# Altium footprint library My Footprint.PcbLib: 268 footprints (part 8 of 17)
Each footprint in its own frame and in the unit in brackets; x right, y up, seen from the top. Pads: shape width x height; smd on the part's side, far side on the other; paste and mask are expansions set on the pad; w line width, h text height; cw(c..) or ccw(c..) is an arc to the next point about the centre after c.
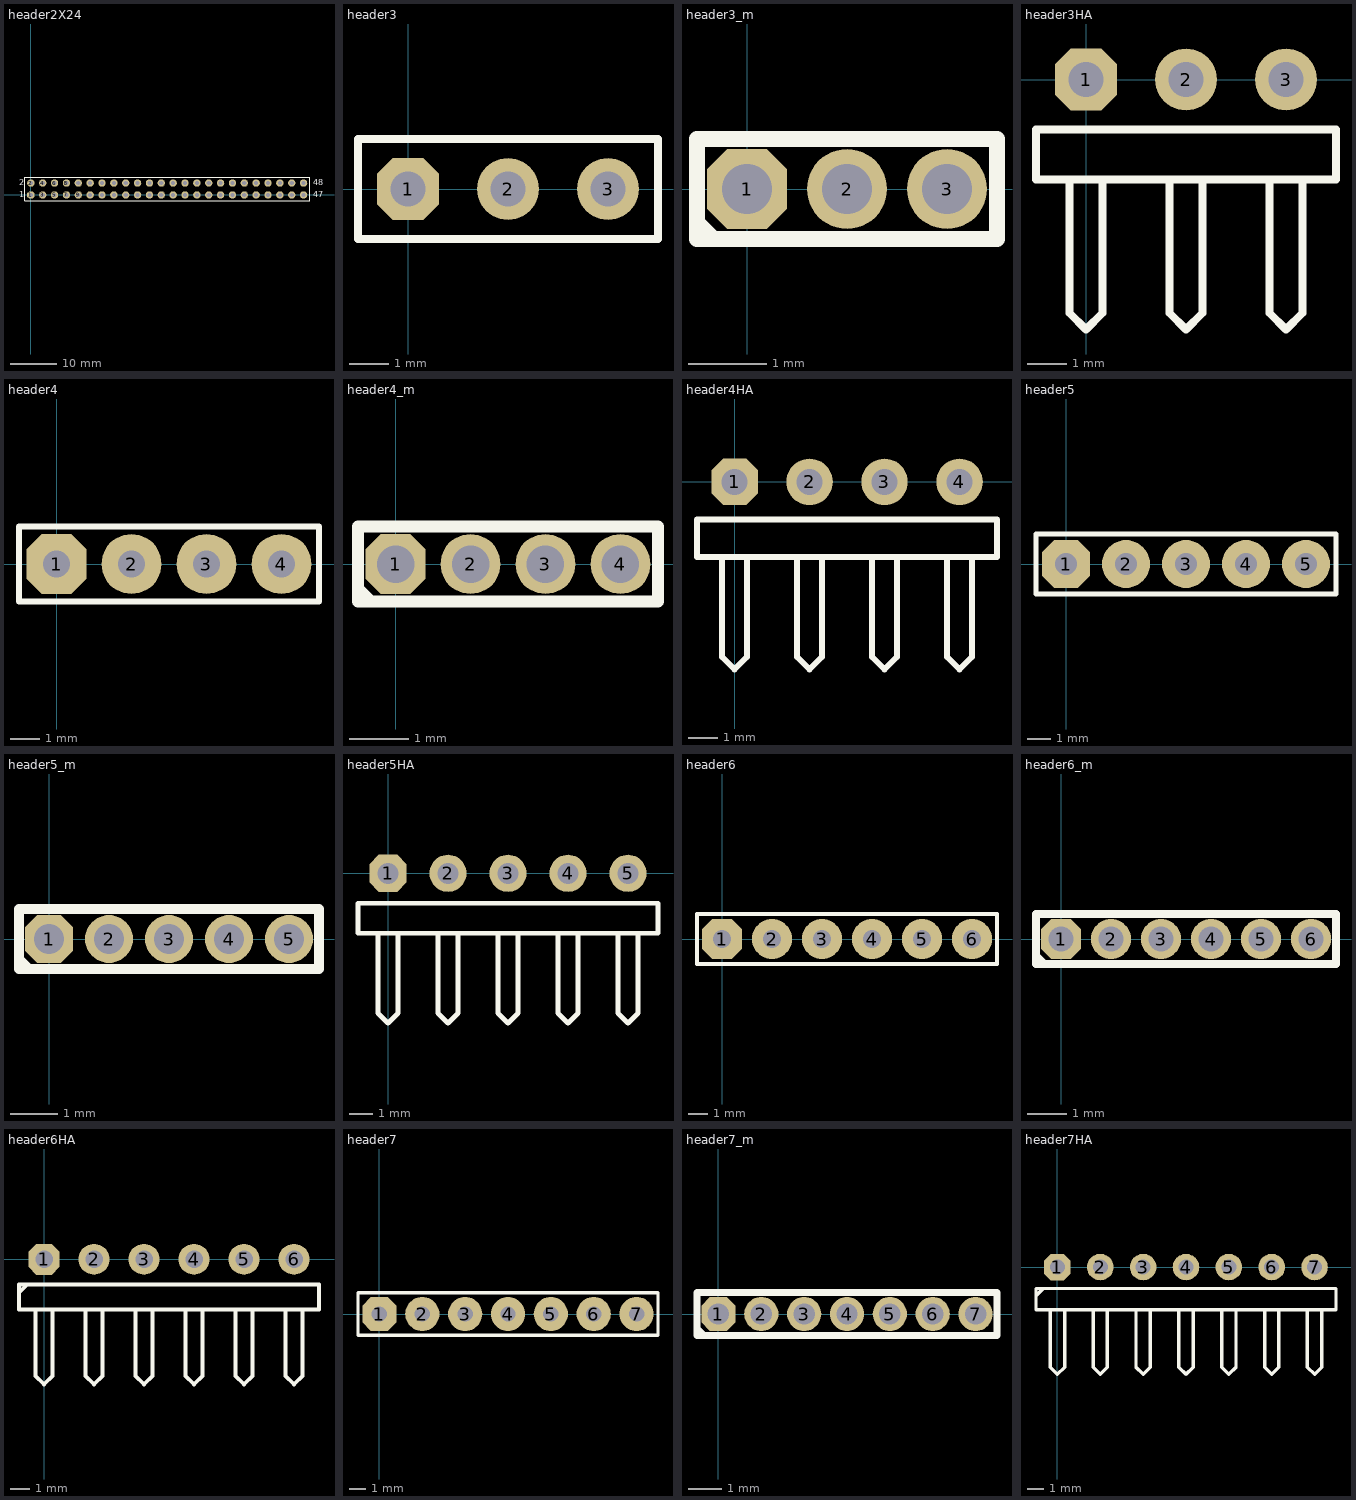
[diagram p7: the footprints below, top view; thin cyan lines are the x and y axes]

## header2X24 [mil]
pads (48):
  oct 62x62 hole 35: 1(0,0)
  round 62 hole 35: 2(0,100) 3(100,0) 4(100,100) 5(200,0) 6(200,100) 7(300,0) 8(300,100) 9(400,0) 10(400,100) 11(500,0) 12(500,100) 13(600,0) 14(600,100) 15(700,0) 16(700,100) 17(800,0) 18(800,100) 19(900,0) 20(900,100) 21(1000,0) 22(1000,100) 23(1100,0) 24(1100,100) 25(1200,0) 26(1200,100) 27(1300,0) 28(1300,100) 29(1400,0) 30(1400,100) 31(1500,0) 32(1500,100) 33(1600,0) 34(1600,100) 35(1700,0) 36(1700,100) 37(1800,0) 38(1800,100) 39(1900,0) 40(1900,100) 41(2000,0) 42(2000,100) 43(2100,0) 44(2100,100) 45(2200,0) 46(2200,100) 47(2300,0) 48(2300,100)
Top Overlay:
  lines w8: -50,-50 2350,-50 2350,150 -50,150 -50,-50
  text "2" at -100,80 h50
  text "1" at -100,-20 h50
  text "48" at 2380,80 h50
  text "47" at 2380,-20 h50

## header3 [mil]
pads (3):
  oct 62x62 hole 35: 1(0,0)
  round 62 hole 35: 2(100,0) 3(200,0)
Top Overlay:
  lines w8: -50,-50 -50,50 250,50 250,-50 -50,-50
3D body "HEADER 3.STEP": height 397.64, standoff -59.06, extent -50,-50 250,50

## header3_m [mil]
pads (3):
  oct 40x40 hole 25: 1(0,0)
  round 40 hole 25: 2(50,0) 3(100,0)
Top Overlay:
  lines w8: -25,-16.67 -16.67,-25 ; -25,-25 -25,25 125,25 125,-25 -25,-25

## header3HA [mil]
pads (3):
  oct 62x62 hole 35: 1(0,0)
  round 62 hole 35: 2(100,0) 3(200,0)
Top Overlay:
  lines w8: -16.67,-100 -16.67,-233.33 0,-250 16.67,-233.33 16.67,-100 ; 83.33,-100 83.33,-233.33 100,-250 116.67,-233.33 116.67,-100 ; 183.33,-100 183.33,-233.33 200,-250 216.67,-233.33 216.67,-100 ; -50,-100 -50,-50 250,-50 250,-100 -50,-100
3D body "HEADER 3H.STEP": height 170.28, standoff -118.11, extent -50,-275.59 250,50

## header4 [mil]
pads (4):
  oct 80x80 hole 36: 1(0,0)
  round 80 hole 36: 2(100,0) 3(200,0) 4(300,0)
Top Overlay:
  lines w8: -50,-50 -50,50 350,50 350,-50 -50,-50
3D body "HEADER 4.STEP": height 397.64, standoff -59.06, extent -50,-50 350,50

## header4_m [mil]
pads (4):
  oct 40x40 hole 25: 1(0,0)
  round 40 hole 25: 2(50,0) 3(100,0) 4(150,0)
Top Overlay:
  lines w8: -25,-16.67 -16.67,-25 ; -25,-25 -25,25 175,25 175,-25 -25,-25

## header4HA [mil]
pads (4):
  oct 62x62 hole 35: 1(0,0)
  round 62 hole 35: 2(100,0) 3(200,0) 4(300,0)
Top Overlay:
  lines w8: -16.67,-100 -16.67,-233.33 0,-250 16.67,-233.33 16.67,-100 ; 83.33,-100 83.33,-233.33 100,-250 116.67,-233.33 116.67,-100 ; 183.33,-100 183.33,-233.33 200,-250 216.67,-233.33 216.67,-100 ; 283.33,-100 283.33,-233.33 300,-250 316.67,-233.33 316.67,-100 ; -50,-100 -50,-50 350,-50 350,-100 -50,-100
3D body "HEADER 4H.STEP": height 170.28, standoff -118.11, extent -50,-275.59 350,50

## header5 [mil]
pads (5):
  oct 80x80 hole 36: 1(0,0)
  round 80 hole 36: 2(100,0) 3(200,0) 4(300,0) 5(400,0)
Top Overlay:
  lines w8: -50,-50 -50,50 450,50 450,-50 -50,-50
3D body "HEADER 5.STEP": height 397.64, standoff -59.06, extent -50,-50 450,50

## header5_m [mil]
pads (5):
  oct 40x40 hole 25: 1(0,0)
  round 40 hole 25: 2(50,0) 3(100,0) 4(150,0) 5(200,0)
Top Overlay:
  lines w8: -25,-16.67 -16.67,-25 ; -25,-25 225,-25 225,25 -25,25 -25,-25

## header5HA [mil]
pads (5):
  oct 62x62 hole 35: 1(0,0)
  round 62 hole 35: 2(100,0) 3(200,0) 4(300,0) 5(400,0)
Top Overlay:
  lines w8: -16.67,-100 -16.67,-233.33 0,-250 16.67,-233.33 16.67,-100 ; 83.33,-100 83.33,-233.33 100,-250 116.67,-233.33 116.67,-100 ; 183.33,-100 183.33,-233.33 200,-250 216.67,-233.33 216.67,-100 ; 283.33,-100 283.33,-233.33 300,-250 316.67,-233.33 316.67,-100 ; 383.33,-100 383.33,-233.33 400,-250 416.67,-233.33 416.67,-100 ; -50,-100 450,-100 450,-50 -50,-50 -50,-100
3D body "HEADER 5H.STEP": height 170.28, standoff -118.11, extent -50,-275.59 450,50

## header6 [mil]
pads (6):
  oct 80x80 hole 36: 1(0,0)
  round 80 hole 36: 2(100,0) 3(200,0) 4(300,0) 5(400,0) 6(500,0)
Top Overlay:
  lines w8: -50,-50 550,-50 550,50 -50,50 -50,-50
3D body "HEADER 6.STEP": height 397.64, standoff -59.06, extent -50,-50 550,50

## header6_m [mil]
pads (6):
  oct 40x40 hole 25: 1(0,0)
  round 40 hole 25: 2(50,0) 3(100,0) 4(150,0) 5(200,0) 6(250,0)
Top Overlay:
  lines w8: -25,-16.67 -16.67,-25 ; -25,-25 -25,25 275,25 275,-25 -25,-25

## header6HA [mil]
pads (6):
  oct 62x62 hole 35: 1(0,0)
  round 62 hole 35: 2(100,0) 3(200,0) 4(300,0) 5(400,0) 6(500,0)
Top Overlay:
  lines w8: -50,-66.67 -33.33,-50 ; -16.67,-100 -16.67,-233.33 0,-250 16.67,-233.33 16.67,-100 ; 83.33,-100 83.33,-233.33 100,-250 116.67,-233.33 116.67,-100 ; 183.33,-100 183.33,-233.33 200,-250 216.67,-233.33 216.67,-100 ; 283.33,-100 283.33,-233.33 300,-250 316.67,-233.33 316.67,-100 ; 383.33,-100 383.33,-233.33 400,-250 416.67,-233.33 416.67,-100 ; 483.33,-100 483.33,-233.33 500,-250 516.67,-233.33 516.67,-100 ; -50,-100 -50,-50 550,-50 550,-100 -50,-100
3D body "HEADER 6H.STEP": height 170.28, standoff -118.11, extent -50,-275.59 550,50

## header7 [mil]
pads (7):
  oct 80x80 hole 36: 1(0,0)
  round 80 hole 36: 2(100,0) 3(200,0) 4(300,0) 5(400,0) 6(500,0) 7(600,0)
Top Overlay:
  lines w8: -50,-50 -50,50 650,50 650,-50 -50,-50
3D body "HEADER 7.STEP": height 397.64, standoff -59.06, extent -50,-50 650,50

## header7_m [mil]
pads (7):
  oct 40x40 hole 25: 1(0,0)
  round 40 hole 25: 2(50,0) 3(100,0) 4(150,0) 5(200,0) 6(250,0) 7(300,0)
Top Overlay:
  lines w8: -25,-16.67 -16.67,-25 ; -25,-25 -25,25 325,25 325,-25 -25,-25

## header7HA [mil]
pads (7):
  oct 62x62 hole 35: 1(0,0)
  round 62 hole 35: 2(100,0) 3(200,0) 4(300,0) 5(400,0) 6(500,0) 7(600,0)
Top Overlay:
  lines w8: -50,-66.67 -33.33,-50 ; -16.67,-100 -16.67,-233.33 0,-250 16.67,-233.33 16.67,-100 ; 83.33,-100 83.33,-233.33 100,-250 116.67,-233.33 116.67,-100 ; 183.33,-100 183.33,-233.33 200,-250 216.67,-233.33 216.67,-100 ; 283.33,-100 283.33,-233.33 300,-250 316.67,-233.33 316.67,-100 ; 383.33,-100 383.33,-233.33 400,-250 416.67,-233.33 416.67,-100 ; 483.33,-100 483.33,-233.33 500,-250 516.67,-233.33 516.67,-100 ; 583.33,-100 583.33,-233.33 600,-250 616.67,-233.33 616.67,-100 ; -50,-100 650,-100 650,-50 -50,-50 -50,-100
3D body "HEADER 7H.STEP": height 170.28, standoff -118.11, extent -50,-275.59 650,50